# Altium footprint library IC.PcbLib: 85 footprints (part 2 of 6)
Each footprint in its own frame and in the unit in brackets; x right, y up, seen from the top. Pads: shape width x height; smd on the part's side, far side on the other; paste and mask are expansions set on the pad; w line width, h text height; cw(c..) or ccw(c..) is an arc to the next point about the centre after c.
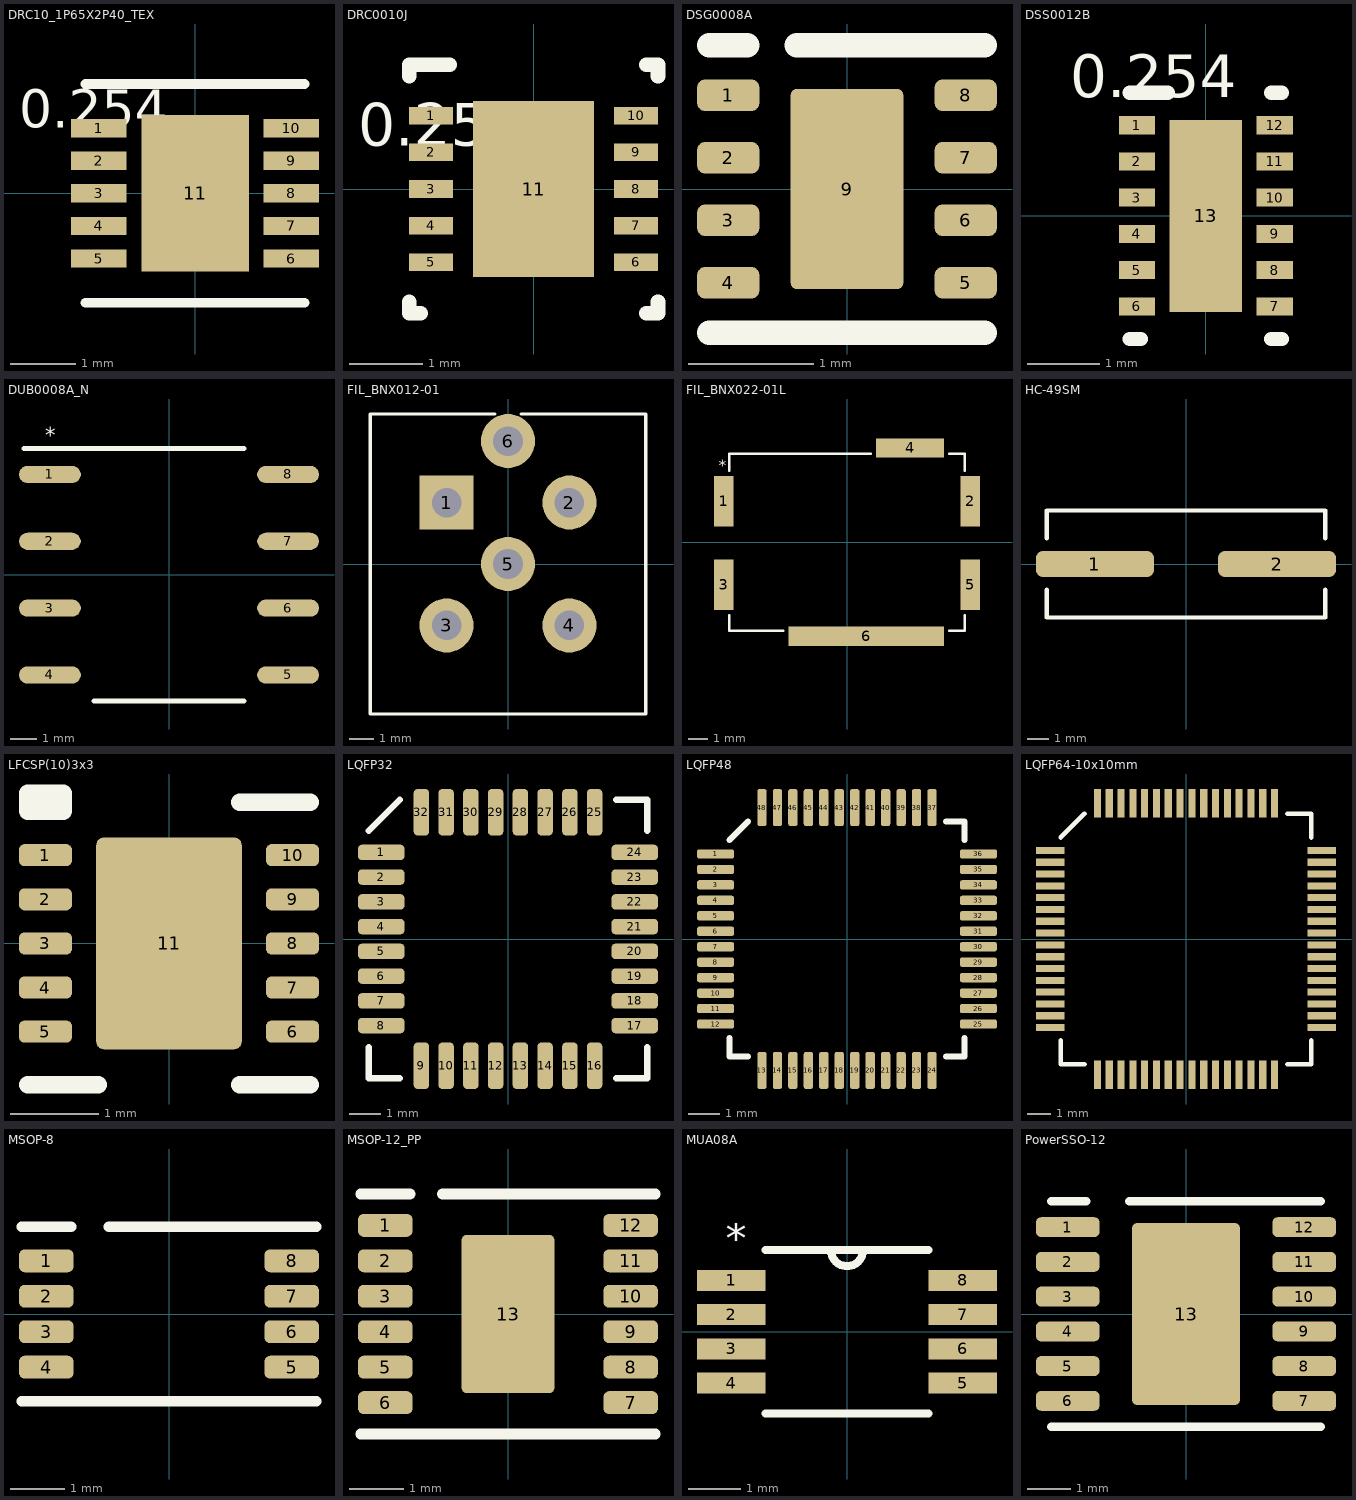
[diagram p1: the footprints below, top view; thin cyan lines are the x and y axes]

## DRC10_1P65X2P40_TEX [mm]
pads (11):
  rect 0.85x0.28 smd: 1(-1.475,1) 2(-1.475,0.5) 3(-1.475,0) 4(-1.475,-0.5) 5(-1.475,-1) 6(1.475,-1) 7(1.475,-0.5) 8(1.475,0) 9(1.475,0.5) 10(1.475,1)
  rect 1.65x2.4 smd: 11(0,0)
Top Layer:
  region: 0,-1.2
  region: 0,1.2
Top Overlay:
  lines w0.152: -1.677,-1.677 1.677,-1.677 ; -1.677,1.677 1.677,1.677
  text "0.254" at -2.7,0.811 h1
Top Solder:
  region: 0,-1.2
  region: 0,1.2
3D body "DRC0010M.stp": height 1, standoff 0, extent -1.5,-1.5 1.5,1.5

## DRC0010J [mm]
pads (11):
  rect 0.6x0.24 smd paste+0 mask+0.051: 1(-1.4,1) 2(-1.4,0.5) 3(-1.4,0) 4(-1.4,-0.5) 5(-1.4,-1) 6(1.4,-1) 7(1.4,-0.5) 8(1.4,0) 9(1.4,0.5) 10(1.4,1)
  rect 1.65x2.4 smd paste-1.187 mask+0.051: 11(0,0)
Top Overlay:
  lines w0.2: -1.7,-1.54 -1.7,-1.7 -1.54,-1.7 ; -1.7,1.54 -1.7,1.7 -1.15,1.7 ; 1.54,-1.7 1.7,-1.7 1.7,-1.54 ; 1.54,1.7 1.7,1.7 1.7,1.54
  text "0.254" at -2.4,0.4 h1
Top Paste:
  region: -0.75,-0.1 -0.75,-1.16 0.75,-1.16 0.75,-0.1
  region: -0.75,1.16 -0.75,0.1 0.75,0.1 0.75,1.16
3D body "DRC0010J.stp": height 1, standoff 0, extent -1.5,-1.5 1.5,1.5

## DSG0008A [mm]
pads (9):
  rrect50% 0.5x0.25 smd: 1(-0.95,0.75) 2(-0.95,0.25) 3(-0.95,-0.25) 4(-0.95,-0.75) 5(0.95,-0.75) 6(0.95,-0.25) 7(0.95,0.25) 8(0.95,0.75)
  rrect10% 0.9x1.6 smd: 9(0,0)
Top Overlay:
  lines w0.2: -1.1,-1.15 1.1,-1.15 ; -1.1,1.15 -0.8,1.15 ; -0.4,1.15 1.1,1.15
Top Paste:
  region: -0.449,0.139 -0.45,0.149 -0.45,0.751 -0.449,0.761 -0.446,0.77 -0.442,0.778 -0.436,0.786 -0.428,0.792 -0.42,0.796 -0.411,0.799 -0.401,0.8 0.401,0.8 0.411,0.799 0.42,0.796 0.428,0.792 0.436,0.786 0.442,0.778 0.446,0.77 0.449,0.761 0.45,0.751 0.45,0.149 0.449,0.139 0.446,0.13 0.442,0.122 0.436,0.114 0.428,0.108 0.42,0.104 0.411,0.101 0.401,0.1 -0.401,0.1 -0.411,0.101 -0.42,0.104 -0.428,0.108 -0.436,0.114 -0.442,0.122 -0.446,0.13
  region: -0.449,-0.761 -0.45,-0.751 -0.45,-0.149 -0.449,-0.139 -0.446,-0.13 -0.442,-0.122 -0.436,-0.114 -0.428,-0.108 -0.42,-0.104 -0.411,-0.101 -0.401,-0.1 0.401,-0.1 0.411,-0.101 0.42,-0.104 0.428,-0.108 0.436,-0.114 0.442,-0.122 0.446,-0.13 0.449,-0.139 0.45,-0.149 0.45,-0.751 0.449,-0.761 0.446,-0.77 0.442,-0.778 0.436,-0.786 0.428,-0.792 0.42,-0.796 0.411,-0.799 0.401,-0.8 -0.401,-0.8 -0.411,-0.799 -0.42,-0.796 -0.428,-0.792 -0.436,-0.786 -0.442,-0.778 -0.446,-0.77
3D body "OPA855IDSGT.STEP": height 0.8, standoff 0, extent -1,-1 1,1

## DSS0012B [mm]
pads (13):
  rect 0.5x0.25 smd paste+0 mask+0.051: 1(-0.95,1.25) 2(-0.95,0.75) 3(-0.95,0.25) 4(-0.95,-0.25) 5(-0.95,-0.75) 6(-0.95,-1.25) 7(0.95,-1.25) 8(0.95,-0.75) 9(0.95,-0.25) 10(0.95,0.25) 11(0.95,0.75) 12(0.95,1.25)
  rect 1x2.65 smd paste-0.5 mask+0.051: 13(0,0)
Top Overlay:
  lines w0.2: -1.05,-1.7 -0.9,-1.7 ; -1.05,1.7 -0.525,1.7 ; 0.9,-1.7 1.05,-1.7 ; 0.9,1.7 1.05,1.7
  text "0.254" at -1.872,1.44 h1
Top Paste:
  region: -0.473,-1.226 -0.474,-1.216 -0.474,-0.152 -0.473,-0.142 -0.471,-0.132 -0.466,-0.123 -0.459,-0.115 -0.451,-0.109 -0.442,-0.104 -0.432,-0.101 -0.422,-0.1 0.422,-0.1 0.432,-0.101 0.442,-0.104 0.451,-0.109 0.459,-0.115 0.466,-0.123 0.471,-0.132 0.473,-0.142 0.474,-0.152 0.474,-1.216 0.473,-1.226 0.471,-1.236 0.466,-1.245 0.459,-1.253 0.451,-1.259 0.442,-1.264 0.432,-1.267 0.422,-1.268 -0.422,-1.268 -0.432,-1.267 -0.442,-1.264 -0.451,-1.259 -0.459,-1.253 -0.466,-1.245 -0.471,-1.236
  region: -0.473,0.142 -0.474,0.152 -0.474,1.216 -0.473,1.226 -0.471,1.236 -0.466,1.245 -0.459,1.253 -0.451,1.259 -0.442,1.264 -0.432,1.267 -0.422,1.268 0.422,1.268 0.432,1.267 0.442,1.264 0.451,1.259 0.459,1.253 0.466,1.245 0.471,1.236 0.473,1.226 0.474,1.216 0.474,0.152 0.473,0.142 0.471,0.132 0.466,0.123 0.459,0.115 0.451,0.109 0.442,0.104 0.432,0.101 0.422,0.1 -0.422,0.1 -0.432,0.101 -0.442,0.104 -0.451,0.109 -0.459,0.115 -0.466,0.123 -0.471,0.132
3D body "DSS0012B.stp": height 0.8, standoff 0, extent -1,-1.5 1,1.5

## DUB0008A_N [mm]
pads (8):
  oval 2.35x0.65 smd paste+0 mask+0.051: 1(-4.525,3.81) 2(-4.525,1.27) 3(-4.525,-1.27) 4(-4.525,-3.81) 5(4.525,-3.81) 6(4.525,-1.27) 7(4.525,1.27) 8(4.525,3.81)
Top Overlay:
  lines w0.2: -5.5,4.8 2.85,4.8 ; -2.85,-4.8 2.85,-4.8
  text "*" at -4.7,4.8 h1
3D body "DUB0008A.stp": height 3.68, standoff 0, extent -5.21,-4.575 5.21,4.575

## FIL_BNX012-01 [mm]
pads (6):
  rect 2.2x2.2 hole 1.2: 1(-2.5,2.5)
  round 2.2 hole 1.2: 2(2.5,2.5) 3(-2.5,-2.5) 4(2.5,-2.5) 5(0,0) 6(0,5)
Top Overlay:
  lines w0.127: -0.53,6.1 -5.6,6.1 -5.6,-6.1 5.6,-6.1 5.6,6.1 0.53,6.1
3D body "BNX012-01--3DModel-STEP-1.STEP": height 8.5, standoff -4, extent -5.5,-6 5.5,6

## FIL_BNX022-01L [mm]
pads (6):
  rect 1x2.6 smd: 1(-6.342,2.1) 2(6.342,2.1) 3(-6.342,-2.2) 5(6.342,-2.2)
  rect 3.5x1 smd: 4(3.25,4.846)
  rect 8x1 smd: 6(1,-4.846)
Top Overlay:
  lines w0.127: -6.05,-3.77 -6.05,-4.55 -3.27,-4.55 ; -6.05,3.67 -6.05,4.55 1.23,4.55 ; 5.27,-4.55 6.05,-4.55 6.05,-3.77 ; 5.27,4.55 6.05,4.55 6.05,3.67
  text "*" at -6.604,3.431 h1
3D body "step_temp.STEP": height 3.2, standoff -0.1, extent -6.05,-4.55 6.05,4.55

## HC-49SM [mm]
pads (2):
  rrect50% 5.5x1.2 smd: 1(-4.25,0) 2(4.25,0)
Top Overlay:
  lines w0.2: -6.5,-1.2 -6.5,-2.5 6.5,-2.5 6.5,-1.2 ; -6.5,1.2 -6.5,2.5 6.5,2.5 6.5,1.2
3D body "User Library-Crystal HC49_US-SM.step": height 4.3, standoff 0, extent -6.4,-2.415 6.4,2.415

## LFCSP(10)3x3 [mm]
pads (11):
  rrect50% 0.6x0.25 smd: 1(-1.4,1) 2(-1.4,0.5) 3(-1.4,0) 4(-1.4,-0.5) 5(-1.4,-1) 6(1.4,-1) 7(1.4,-0.5) 8(1.4,0) 9(1.4,0.5) 10(1.4,1)
  rrect10% 1.65x2.4 smd: 11(0,0)
Top Overlay:
  rectangle: -1.6,1.5 -1.2,1.7
  lines w0.2: -1.6,-1.6 -0.8,-1.6 ; -1.5,1.7 -1.2,1.7 -1.2,1.5 -1.6,1.5 -1.6,1.7 -1.4,1.7 ; 0.8,-1.6 1.6,-1.6 ; 0.8,1.6 1.6,1.6
3D body "DSC0010J.stp": height 0.8, standoff 0, extent -1.5,-1.5 1.5,1.5

## LQFP32 [mm]
pads (32):
  rrect50% 1.5x0.5 smd: 1(-4.1,2.8) 2(-4.1,2) 3(-4.1,1.2) 4(-4.1,0.4) 5(-4.1,-0.4) 6(-4.1,-1.2) 7(-4.1,-2) 8(-4.1,-2.8) 17(4.1,-2.8) 18(4.1,-2) 19(4.1,-1.2) 20(4.1,-0.4) 21(4.1,0.4) 22(4.1,1.2) 23(4.1,2) 24(4.1,2.8)
  rrect50% 0.5x1.5 smd: 9(-2.8,-4.1) 10(-2,-4.1) 11(-1.2,-4.1) 12(-0.4,-4.1) 13(0.4,-4.1) 14(1.2,-4.1) 15(2,-4.1) 16(2.8,-4.1) 25(2.8,4.1) 26(2,4.1) 27(1.2,4.1) 28(0.4,4.1) 29(-0.4,4.1) 30(-1.2,4.1) 31(-2,4.1) 32(-2.8,4.1)
Top Overlay:
  lines w0.2: -4.5,-3.5 -4.5,-4.5 -3.5,-4.5 ; -4.5,3.5 -3.5,4.5 ; 3.5,-4.5 4.5,-4.5 4.5,-3.5 ; 3.5,4.5 4.5,4.5 4.5,3.5
3D body "LQFP-32.step": height 1.6, standoff 0, extent -4.496,-4.496 4.496,4.496

## LQFP48 [mm]
pads (48):
  rrect50% 1.2x0.3 smd: 1(-4.25,2.75) 2(-4.25,2.25) 3(-4.25,1.75) 4(-4.25,1.25) 5(-4.25,0.75) 6(-4.25,0.25) 7(-4.25,-0.25) 8(-4.25,-0.75) 9(-4.25,-1.25) 10(-4.25,-1.75) 11(-4.25,-2.25) 12(-4.25,-2.75) 25(4.25,-2.75) 26(4.25,-2.25) 27(4.25,-1.75) 28(4.25,-1.25) 29(4.25,-0.75) 30(4.25,-0.25) 31(4.25,0.25) 32(4.25,0.75) 33(4.25,1.25) 34(4.25,1.75) 35(4.25,2.25) 36(4.25,2.75)
  rrect50% 0.3x1.2 smd: 13(-2.75,-4.25) 14(-2.25,-4.25) 15(-1.75,-4.25) 16(-1.25,-4.25) 17(-0.75,-4.25) 18(-0.25,-4.25) 19(0.25,-4.25) 20(0.75,-4.25) 21(1.25,-4.25) 22(1.75,-4.25) 23(2.25,-4.25) 24(2.75,-4.25) 37(2.75,4.25) 38(2.25,4.25) 39(1.75,4.25) 40(1.25,4.25) 41(0.75,4.25) 42(0.25,4.25) 43(-0.25,4.25) 44(-0.75,4.25) 45(-1.25,4.25) 46(-1.75,4.25) 47(-2.25,4.25) 48(-2.75,4.25)
Top Overlay:
  lines w0.2: -3.8,-3.2 -3.8,-3.8 -3.2,-3.8 ; 3.2,-3.8 3.8,-3.8 3.8,-3.2 ; 3.2,3.8 3.8,3.8 3.8,3.2 ; -3.8,3.2 -3.8,3.2 ; -3.8,3.2 -3.2,3.8 ; -3.2,3.8 -3.2,3.8
3D body "User Library-Quad50M48.step": height 1.56, standoff 0, extent -4.5,-4.511 4.5,4.489

## LQFP64-10x10mm [mm]
pads (64):
  rect 1.2x0.3 smd: 1(-5.75,3.75) 2(-5.75,3.25) 3(-5.75,2.75) 4(-5.75,2.25) 5(-5.75,1.75) 6(-5.75,1.25) 7(-5.75,0.75) 8(-5.75,0.25) 9(-5.75,-0.25) 10(-5.75,-0.75) 11(-5.75,-1.25) 12(-5.75,-1.75) 13(-5.75,-2.25) 14(-5.75,-2.75) 15(-5.75,-3.25) 16(-5.75,-3.75) 33(5.75,-3.75) 34(5.75,-3.25) 35(5.75,-2.75) 36(5.75,-2.25) 37(5.75,-1.75) 38(5.75,-1.25) 39(5.75,-0.75) 40(5.75,-0.25) 41(5.75,0.25) 42(5.75,0.75) 43(5.75,1.25) 44(5.75,1.75) 45(5.75,2.25) 46(5.75,2.75) 47(5.75,3.25) 48(5.75,3.75)
  rect 0.3x1.2 smd: 17(-3.75,-5.75) 18(-3.25,-5.75) 19(-2.75,-5.75) 20(-2.25,-5.75) 21(-1.75,-5.75) 22(-1.25,-5.75) 23(-0.75,-5.75) 24(-0.25,-5.75) 25(0.25,-5.75) 26(0.75,-5.75) 27(1.25,-5.75) 28(1.75,-5.75) 29(2.25,-5.75) 30(2.75,-5.75) 31(3.25,-5.75) 32(3.75,-5.75) 49(3.75,5.75) 50(3.25,5.75) 51(2.75,5.75) 52(2.25,5.75) 53(1.75,5.75) 54(1.25,5.75) 55(0.75,5.75) 56(0.25,5.75) 57(-0.25,5.75) 58(-0.75,5.75) 59(-1.25,5.75) 60(-1.75,5.75) 61(-2.25,5.75) 62(-2.75,5.75) 63(-3.25,5.75) 64(-3.75,5.75)
Top Overlay:
  lines w0.2: -5.3,-4.3 -5.3,-5.3 -4.3,-5.3 ; -5.3,4.3 -4.3,5.3 ; 4.3,-5.3 5.3,-5.3 5.3,-4.3 ; 4.3,5.3 5.3,5.3 5.3,4.3
3D body "LQFP64-10x10mm.step": height 1.6, standoff 0, extent -5.997,-5.997 5.997,5.997

## MSOP-8 [mm]
pads (8):
  rrect50% 1x0.42 smd: 1(-2.25,0.975) 2(-2.25,0.325) 3(-2.25,-0.325) 4(-2.25,-0.975) 5(2.25,-0.975) 6(2.25,-0.325) 7(2.25,0.325) 8(2.25,0.975)
Top Overlay:
  lines w0.2: -2.7,-1.6 2.7,-1.6 ; -2.7,1.6 -1.8,1.6 ; -1.1,1.6 2.7,1.6
3D body "MSOP-8.STEP": height 1, standoff -0.07, extent -2.51,-1.5 2.511,1.5

## MSOP-12_PP [mm]
pads (13):
  rrect50% 1x0.42 smd: 1(-2.25,1.625) 2(-2.25,0.975) 3(-2.25,0.325) 4(-2.25,-0.325) 5(-2.25,-0.975) 6(-2.25,-1.625) 7(2.25,-1.625) 8(2.25,-0.975) 9(2.25,-0.325) 10(2.25,0.325) 11(2.25,0.975) 12(2.25,1.625)
  rrect10% 1.7x2.9 smd: 13(0,0)
Top Overlay:
  lines w0.2: -2.7,-2.2 2.7,-2.2 ; -2.7,2.2 -1.8,2.2 ; -1.2,2.2 2.7,2.2
3D body "MSOP12_LT3094IMSETRPBF_ADI.step": height 1.09, standoff 0, extent -2.527,-2.07 2.527,2.07

## MUA08A [mm]
pads (8):
  rect 1.3x0.4 smd mask+0.102: 1(-2.197,0.975) 2(-2.197,0.325) 3(-2.197,-0.325) 4(-2.197,-0.975) 5(2.197,-0.975) 6(2.197,-0.325) 7(2.197,0.325) 8(2.197,0.975)
Top Overlay:
  lines w0.152: -1.549,-1.549 1.549,-1.549 ; -1.549,1.549 1.549,1.549 ; -0.305,1.549 ccw(c0,1.549) 0.305,1.549
  text "*" at -2.3,1.3 h1
3D body "DGK0008A.stp": height 1.1, standoff 0, extent -2.451,-1.498 2.451,1.499

## PowerSSO-12 [mil]
pads (13):
  rrect50% 57.5x18 smd: 1(-107.25,78.74) 2(-107.25,47.24) 3(-107.25,15.75) 4(-107.25,-15.75) 5(-107.25,-47.24) 6(-107.25,-78.74) 7(107.25,-78.74) 8(107.25,-47.24) 9(107.25,-15.75) 10(107.25,15.75) 11(107.25,47.24) 12(107.25,78.74)
  rrect10% 98x165 smd: 13(0,0)
Top Overlay:
  lines w7.87: -122.05,-102.36 122.05,-102.36 ; -122.05,102.36 -90.55,102.36 ; -51.18,102.36 122.05,102.36
3D body "PowerSSO-12_STM.step": height 64.09, standoff 0, extent -122.01,-98.5 122.01,98.5